# Altium footprint library IC.PcbLib: 108 footprints (part 8 of 8)
Each footprint in its own frame and in the unit in brackets; x right, y up, seen from the top. Pads: shape width x height; smd on the part's side, far side on the other; paste and mask are expansions set on the pad; w line width, h text height; cw(c..) or ccw(c..) is an arc to the next point about the centre after c.
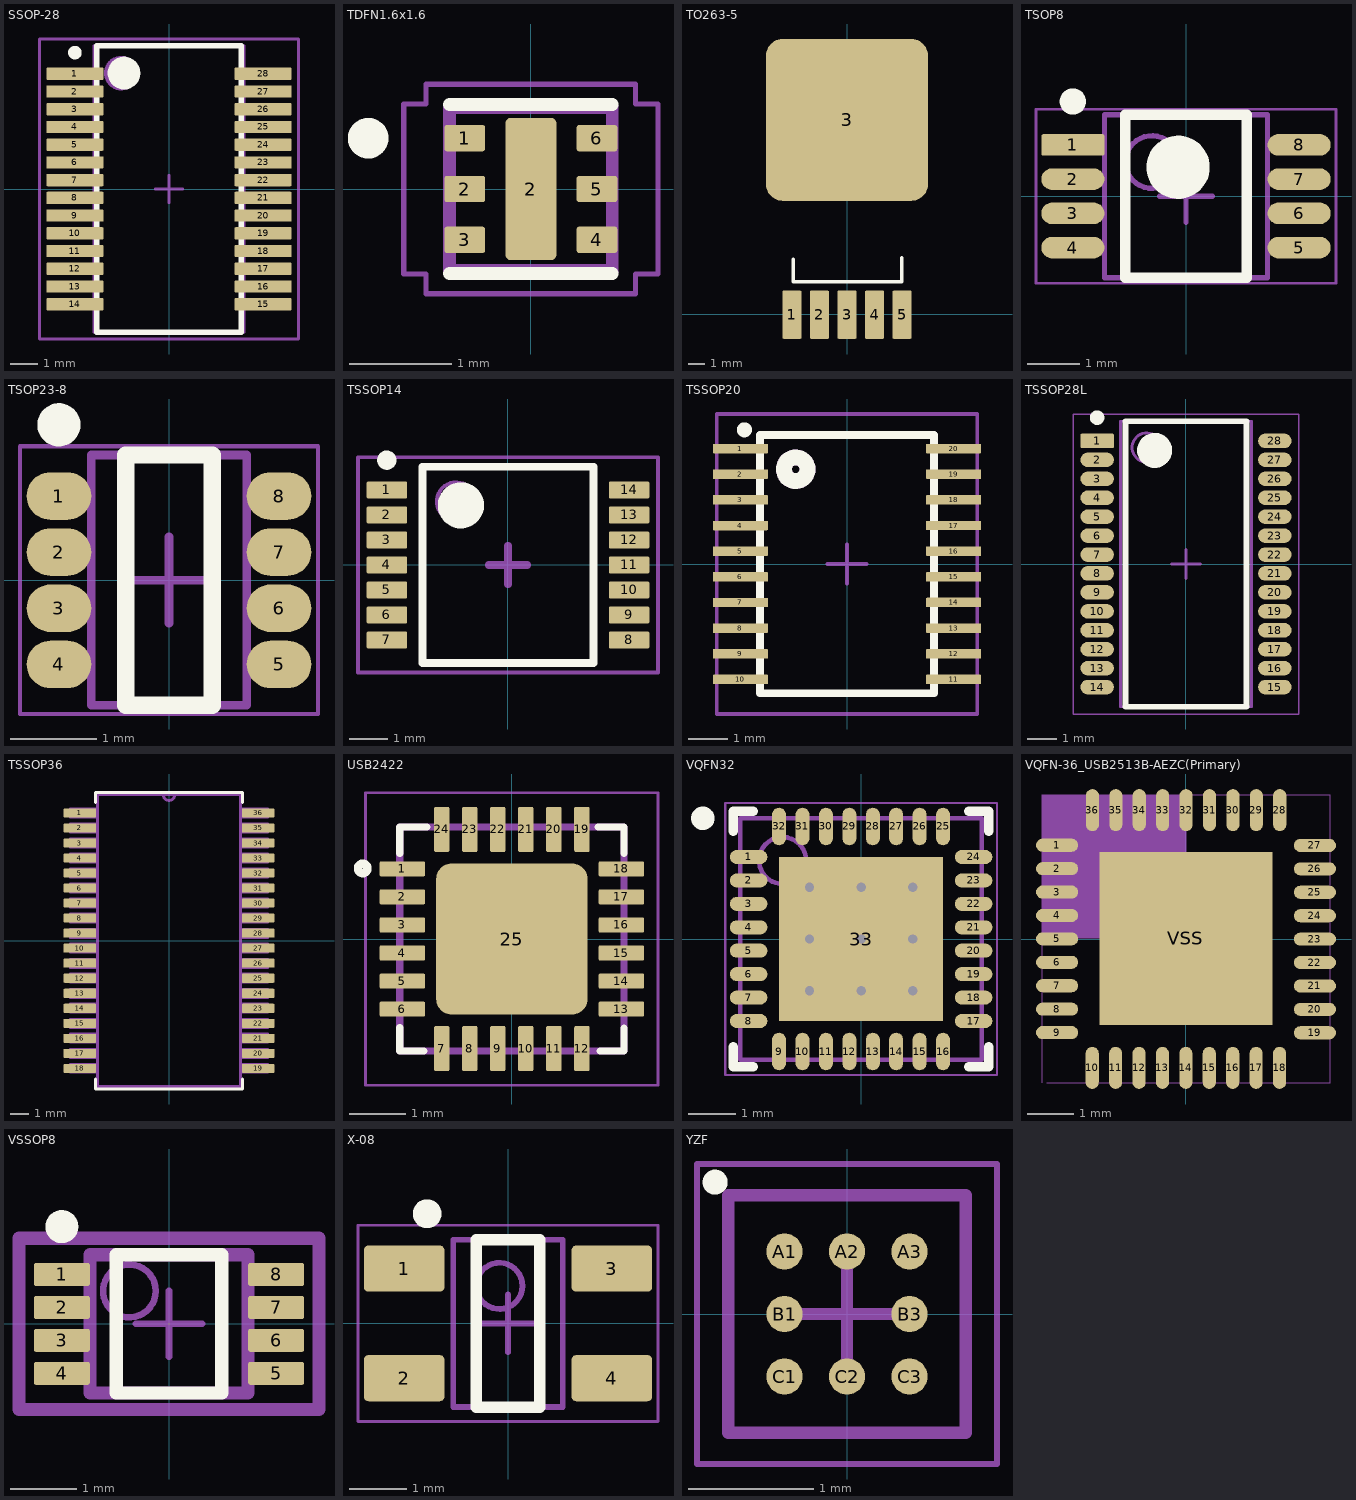
[diagram p7: the footprints below, top view; thin cyan lines are the x and y axes]

## SSOP-28 [mm] "ADS1282IPWR , SOP, 28-Leads, Body 10,5x5,3mm (max), Pitch 0,65mm, IPC Medium Density"
height 2.65
pads (28):
  rrect20% 2.1x0.45 smd: 1(-3.45,4.225) 2(-3.45,3.575) 3(-3.45,2.925) 4(-3.45,2.275) 5(-3.45,1.625) 6(-3.45,0.975) 7(-3.45,0.325) 8(-3.45,-0.325) 9(-3.45,-0.975) 10(-3.45,-1.625) 11(-3.45,-2.275) 12(-3.45,-2.925) 13(-3.45,-3.575) 14(-3.45,-4.225) 15(3.45,-4.225) 16(3.45,-3.575) 17(3.45,-2.925) 18(3.45,-2.275) 19(3.45,-1.625) 20(3.45,-0.975) 21(3.45,-0.325) 22(3.45,0.325) 23(3.45,0.975) 24(3.45,1.625) 25(3.45,2.275) 26(3.45,2.925) 27(3.45,3.575) 28(3.45,4.225)
Top Overlay:
  circle w0.25: c-3.45,5 r0.125
  circle w0.6: c-1.65,4.25 r0.3
  lines w0.2: -2.65,-5.25 -2.65,5.25 2.65,5.25 2.65,-5.25 -2.65,-5.25
M3_comm_top:
  text ".comment" at -3,-0.51 h2
M5_asm_top:
  circle w0.154: c-1.75,4.25 r0.559
  lines w0.1: -2.75,-5.25 2.75,-5.25 2.75,5.25 -2.75,5.25 -2.75,-5.25
  text ".Designator" at -1.75,5.5 h2
M7_courtyard_top:
  lines w0.1: -0.5,0 0.5,0 ; 0,-0.5 0,0.5 ; -4.75,-5.5 -4.75,5.5 4.75,5.5 4.75,-5.5 -4.75,-5.5
3D body "SSOP-28-FT232RL.STEP": height 2.16, standoff 0, extent -3.878,-5.175 3.878,5.155

## TDFN1.6x1.6 [mm] "MIC826TYMT-TR"
pads (7):
  rrect20% 0.4x0.26 smd: 1(-0.65,0.5) 2(-0.65,0) 3(-0.65,-0.5) 4(0.65,-0.5) 5(0.65,0) 6(0.65,0.5)
  rrect20% 0.5x1.4 smd: 2(0,0)
Top Overlay:
  circle w0.2: c-1.6,0.5 r0.1
  lines w0.127: -0.8,-0.83 0.8,-0.83 ; -0.8,0.83 0.8,0.83
Top Paste:
  region: 0.15,-0.568 -0.151,-0.568 -0.151,-0.035 0.15,-0.035
  region: -0.151,0.565 0.15,0.565 0.15,0.035 -0.151,0.035
M1_3D_TOP:
  lines w0.05: -1.25,-0.835 -1.25,0.835 -1.03,0.835 -1.03,1.03 1.03,1.03 1.03,0.835 1.25,0.835 1.25,-0.835 1.03,-0.835 1.03,-1.03 -1.03,-1.03 -1.03,-0.835 -1.25,-0.835
  lines w0.127: -0.8,-0.8 -0.8,0.8 0.8,0.8 0.8,-0.8 -0.8,-0.8
3D body: height 0.61, standoff 0.6, extent -0.599,0.4 -0.4,0.6
3D body: height 0.6, standoff 0, extent -0.8,-0.8 0.8,0.8

## TO263-5 [mm]
height 0.025
pads (6):
  rrect20% 1.2x3 smd mask+0.102: 1(-3.4,-0.033) 2(-1.7,-0.033) 3(0,-0.033) 4(1.7,-0.033) 5(3.4,-0.033)
  rrect20% 10x10 smd: 3(0,12)
Top Overlay:
  lines w0.203: -3.317,3.4 -3.317,1.999 3.389,1.999 3.389,3.5
3D body "SW3dPS-TO263-5.STEP": height 4.83, standoff 0.03, extent -5,-0.99 5,14.68

## TSOP8 [mm] "TSOP, 8-Leads, Body 3,10x3,10mm, Pitch 0,65mm, IPC High Density"
height 1.1
pads (8):
  rrect20% 1.2x0.41 smd: 1(-2.15,0.975)
  oval 1.2x0.41 smd: 2(-2.15,0.325) 3(-2.15,-0.325) 4(-2.15,-0.975) 5(2.15,-0.975) 6(2.15,-0.325) 7(2.15,0.325) 8(2.15,0.975)
Top Overlay:
  circle w0.6: c-0.15,0.55 r0.3
  circle w0.25: c-2.15,1.8 r0.125
  lines w0.2: -1.15,-1.55 1.15,-1.55 1.15,1.55 -1.15,1.55 -1.15,-1.55
Mechanical 13:
  circle w0.1: c-0.65,0.65 r0.5
  lines w0.1: -1.55,-1.55 1.55,-1.55 1.55,1.55 -1.55,1.55 -1.55,-1.55
Mechanical 15:
  lines w0.05: -2.85,-1.65 2.85,-1.65 2.85,1.65 -2.85,1.65 -2.85,-1.65
  lines w0.1: -0.5,0 0.5,0 ; 0,-0.5 0,0.5
3D body "TSOP8.step": height 1.1, standoff 0, extent -2.525,-1.55 2.525,1.55

## TSOP23-8 [mm] "TSOP, 8-Leads, Body 2,90x1,75mm, Pitch 0,65mm, IPC High Density"
height 1
pads (8):
  oval 0.75x0.55 smd: 1(-1.275,0.975) 2(-1.275,0.325) 3(-1.275,-0.325) 4(-1.275,-0.975) 5(1.275,-0.975) 6(1.275,-0.325) 7(1.275,0.325) 8(1.275,0.975)
Top Overlay:
  circle w0.25: c-1.275,1.8 r0.125
  lines w0.2: -0.5,-1.45 0.5,-1.45 0.5,1.45 -0.5,1.45 -0.5,-1.45
Mechanical 13:
  lines w0.1: -0.9,-1.45 0.9,-1.45 0.9,1.45 -0.9,1.45 -0.9,-1.45
Mechanical 15:
  lines w0.05: -1.725,-1.55 1.725,-1.55 1.725,1.55 -1.725,1.55 -1.725,-1.55
  lines w0.1: -0.5,0 0.5,0 ; 0,-0.5 0,0.5
3D body "TSOP23-8.step": height 1, standoff -0.02, extent -1.5,-1.45 1.5,1.45

## TSSOP14 [mm] "TLV8544PWR.TSOP, 14-Leads, Body 5,00x4,40mm, Pitch 0,65mm, IPC Medium Density"
height 1.2
pads (14):
  rrect20% 1.05x0.45 smd: 1(-3.15,1.95) 2(-3.15,1.3) 3(-3.15,0.65) 4(-3.15,0) 5(-3.15,-0.65) 6(-3.15,-1.3) 7(-3.15,-1.95) 8(3.15,-1.95) 9(3.15,-1.3) 10(3.15,-0.65) 11(3.15,0) 12(3.15,0.65) 13(3.15,1.3) 14(3.15,1.95)
Top Overlay:
  circle w0.25: c-3.15,2.725 r0.125
  circle w0.6: c-1.225,1.55 r0.3
  lines w0.2: -2.225,-2.55 -2.225,2.55 2.225,2.55 2.225,-2.55 -2.225,-2.55
M3_comm_top:
  text ".comment" at -0.9,-0.3 h1
M5_asm_top:
  circle w0.1: c-1.35,1.65 r0.5
  lines w0.1: -2.25,-2.55 -2.25,2.55 2.25,2.55 2.25,-2.55 -2.25,-2.55
  text ".Designator" at -1,1.3 h1
M7_courtyard_top:
  lines w0.1: -0.5,0 0.5,0 ; 0,-0.5 0,0.5 ; -3.9,-2.8 -3.9,2.8 3.9,2.8 3.9,-2.8 -3.9,-2.8
  lines w0.2: -0.5,0 0.5,0 ; 0,-0.5 0,0.5
3D body "TSSOP14.step": height 1.2, standoff 0, extent -3.4,-2.55 3.2,2.55

## TSSOP20 [mm] "HI-8444"
height 1.2
pads (20):
  rrect20% 1.4x0.24 smd: 1(-2.7,2.925) 2(-2.7,2.275) 3(-2.7,1.625) 4(-2.7,0.975) 5(-2.7,0.325) 6(-2.7,-0.325) 7(-2.7,-0.975) 8(-2.7,-1.625) 9(-2.7,-2.275) 10(-2.7,-2.925) 11(2.7,-2.925) 12(2.7,-2.275) 13(2.7,-1.625) 14(2.7,-0.975) 15(2.7,-0.325) 16(2.7,0.325) 17(2.7,0.975) 18(2.7,1.625) 19(2.7,2.275) 20(2.7,2.925)
Top Overlay:
  circle w0.4: c-1.3,2.4 r0.3
  circle w0.2: c-2.6,3.4 r0.09
  lines w0.2: -2.2,-3.275 2.2,-3.275 2.2,3.27 -2.2,3.27 -2.2,-3.275
M3_comm_top:
  text ".comment" at 0,0 h1
M5_asm_top:
  circle w0.4: c-1.3,2.4 r0.3
  lines w0.1: -2.2,-3.27 2.2,-3.27 2.2,3.27 -2.2,3.27 -2.2,-3.27
  text ".Designator" at -0.8,3.5 h1
M7_courtyard_top:
  lines w0.1: -0.5,0 0.5,0 ; 0,-0.5 0,0.5 ; -3.3,-3.8 3.3,-3.8 3.3,3.8 -3.3,3.8 -3.3,-3.8
3D body "User Library-TSSOP-20-2.STEP": height 1.2, standoff 0, extent -3.2,-3.25 3.2,3.25

## TSSOP28L [mm] "TSSOP28L, IPC Medium Density"
height 1.2
pads (28):
  rrect20% 1.15x0.5 smd: 1(-3.05,4.225)
  oval 1.15x0.5 smd: 2(-3.05,3.575) 3(-3.05,2.925) 4(-3.05,2.275) 5(-3.05,1.625) 6(-3.05,0.975) 7(-3.05,0.325) 8(-3.05,-0.325) 9(-3.05,-0.975) 10(-3.05,-1.625) 11(-3.05,-2.275) 12(-3.05,-2.925) 13(-3.05,-3.575) 14(-3.05,-4.225) 15(3.05,-4.225) 16(3.05,-3.575) 17(3.05,-2.925) 18(3.05,-2.275) 19(3.05,-1.625) 20(3.05,-0.975) 21(3.05,-0.325) 22(3.05,0.325) 23(3.05,0.975) 24(3.05,1.625) 25(3.05,2.275) 26(3.05,2.925) 27(3.05,3.575) 28(3.05,4.225)
Top Overlay:
  circle w0.6: c-1.075,3.9 r0.3
  circle w0.25: c-3.05,5.025 r0.125
  lines w0.2: -2.075,-4.9 2.075,-4.9 2.075,4.9 -2.075,4.9 -2.075,-4.9
Mechanical 13:
  circle w0.1: c-1.35,4 r0.5
  lines w0.1: -2.25,-4.9 2.25,-4.9 2.25,4.9 -2.25,4.9 -2.25,-4.9
Mechanical 15:
  lines w0.05: -3.875,-5.15 3.875,-5.15 3.875,5.15 -3.875,5.15 -3.875,-5.15
  lines w0.1: -0.5,0 0.5,0 ; 0,-0.5 0,0.5
3D body "TSSOP-28_P065.STEP": height 0.98, standoff -0.01, extent -3.2,-4.85 3.2,4.85

## TSSOP36 [mil] "max7300"
pads (36):
  rrect20% 68x19 smd: 1(-187,267.75) 2(-187,236.25) 3(-187,204.75) 4(-187,173.25) 5(-187,141.75) 6(-187,110.25) 7(-187,78.75) 8(-187,47.25) 9(-187,15.75) 10(-187,-15.75) 11(-187,-47.25) 12(-187,-78.75) 13(-187,-110.25) 14(-187,-141.75) 15(-187,-173.25) 16(-187,-204.75) 17(-187,-236.25) 18(-187,-267.75) 19(187,-267.75) 20(187,-236.25) 21(187,-204.75) 22(187,-173.25) 23(187,-141.75) 24(187,-110.25) 25(187,-78.75) 26(187,-47.25) 27(187,-15.75) 28(187,15.75) 29(187,47.25) 30(187,78.75) 31(187,110.25) 32(187,141.75) 33(187,173.25) 34(187,204.75) 35(187,236.25) 36(187,267.75)
Top Overlay:
  lines w6: -154,-290 -154,-311 154,-311 154,-290 ; -154,290 -154,311 154,311 154,290
M4_comm_bot:
  drawing of 302 lines, arcs and shapes, not listed

## USB2422 [mm] "QFN50P400X400X90-25N"
pads (25):
  rrect20% 0.81x0.27 smd: 1(-1.955,1.25) 2(-1.955,0.75) 3(-1.955,0.25) 4(-1.955,-0.25) 5(-1.955,-0.75) 6(-1.955,-1.25) 13(1.955,-1.25) 14(1.955,-0.75) 15(1.955,-0.25) 16(1.955,0.25) 17(1.955,0.75) 18(1.955,1.25)
  rrect20% 0.27x0.81 smd: 7(-1.25,-1.955) 8(-0.75,-1.955) 9(-0.25,-1.955) 10(0.25,-1.955) 11(0.75,-1.955) 12(1.25,-1.955) 19(1.25,1.955) 20(0.75,1.955) 21(0.25,1.955) 22(-0.25,1.955) 23(-0.75,1.955) 24(-1.25,1.955)
  rrect20% 2.7x2.7 smd: 25(0,0)
Top Overlay:
  circle w0.15: c-2.66,1.26 r0.085
  lines w0.127: -2,-1.58 -2,-2 -1.57,-2 ; -2,1.53 -2,2 -1.51,2 ; 1.54,2 2,2 2,1.53 ; 1.58,-2 2,-2 2,-1.59
Top Paste:
  region: -1.278,0.854 0.854,0.854 0.854,-1.278 -1.278,-1.278
M1_3D_TOP:
  lines w0.05: -2.61,-2.61 -2.61,2.61 2.61,2.61 2.61,-2.61 -2.61,-2.61
  lines w0.127: -2,-2 -2,2 2,2 2,-2 -2,-2

## VQFN32 [mm] "TLK105L, QFN, 32-Leads, Body 5,15x5,15mm, Pitch 0,50mm, Thermal Pad 3,50x3,50mm, IPC High Density"
height 1
pads (33):
  oval 0.8x0.3 smd: 1(-2.4,1.75) 2(-2.4,1.25) 3(-2.4,0.75) 4(-2.4,0.25) 5(-2.4,-0.25) 6(-2.4,-0.75) 7(-2.4,-1.25) 8(-2.4,-1.75) 17(2.4,-1.75) 18(2.4,-1.25) 19(2.4,-0.75) 20(2.4,-0.25) 21(2.4,0.25) 22(2.4,0.75) 23(2.4,1.25) 24(2.4,1.75)
  oval 0.3x0.8 smd: 9(-1.75,-2.4) 10(-1.25,-2.4) 11(-0.75,-2.4) 12(-0.25,-2.4) 13(0.25,-2.4) 14(0.75,-2.4) 15(1.25,-2.4) 16(1.75,-2.4) 25(1.75,2.4) 26(1.25,2.4) 27(0.75,2.4) 28(0.25,2.4) 29(-0.25,2.4) 30(-0.75,2.4) 31(-1.25,2.4) 32(-1.75,2.4)
  rect 3.5x3.5 smd: 33(0,0)
via 1.1,-1.1 diameter 0.5 hole 0.2
via 0,-1.1 diameter 0.5 hole 0.2
via -1.1,-1.1 diameter 0.5 hole 0.2
via 1.1,0 diameter 0.5 hole 0.2
via 0,0 diameter 0.5 hole 0.2
via -1.1,0 diameter 0.5 hole 0.2
via 1.1,1.1 diameter 0.5 hole 0.2
via 0,1.1 diameter 0.5 hole 0.2
via -1.1,1.1 diameter 0.5 hole 0.2
Top Overlay:
  circle w0.25: c-3.375,2.575 r0.125
  lines w0.2: -2.725,-2.3 -2.725,-2.725 -2.3,-2.725 ; -2.725,2.3 -2.725,2.725 -2.3,2.725 ; 2.3,-2.725 2.725,-2.725 2.725,-2.3 ; 2.3,2.725 2.725,2.725 2.725,2.3
Mechanical 13:
  circle w0.1: c-1.675,1.675 r0.5
  lines w0.1: -2.575,-2.575 2.575,-2.575 2.575,2.575 -2.575,2.575 -2.575,-2.575
Mechanical 15:
  lines w0.05: -2.9,-2.9 2.9,-2.9 2.9,2.9 -2.9,2.9 -2.9,-2.9
  lines w0.1: -0.5,0 0.5,0 ; 0,-0.5 0,0.5
3D body "VQFN32.step": height 1, standoff 0, extent -2.625,-2.625 2.625,2.625

## VQFN-36_USB2513B-AEZC(Primary) [mm] "USB2513B-AEZC"
pads (37):
  oval 0.9x0.28 smd: 1(-2.753,2.002) 2(-2.753,1.502) 3(-2.753,1.002) 4(-2.753,0.502) 5(-2.753,0.002) 6(-2.753,-0.498) 7(-2.753,-0.998) 8(-2.753,-1.498) 9(-2.753,-1.998) 19(2.753,-2.002) 20(2.753,-1.502) 21(2.753,-1.002) 22(2.753,-0.502) 23(2.753,-0.002) 24(2.753,0.498) 25(2.753,0.998) 26(2.753,1.498) 27(2.753,1.998)
  oval 0.28x0.9 smd: 10(-2.003,-2.752) 11(-1.502,-2.752) 12(-1.002,-2.752) 13(-0.503,-2.752) 14(-0.002,-2.752) 15(0.497,-2.752) 16(0.998,-2.752) 17(1.498,-2.752) 18(1.997,-2.752) 28(2.002,2.752) 29(1.502,2.752) 30(1.002,2.752) 31(0.502,2.752) 32(0.002,2.752) 33(-0.498,2.752) 34(-0.998,2.752) 35(-1.498,2.752) 36(-1.998,2.752)
  rect 3.7x3.7 smd: VSS(0,0.012)
M1_3D_TOP:
  region: -3.07,3.081 0.001,3.081 0.001,0.018 -3.07,0.018
  lines w0: -3.07,-3.072 -3.07,3.078 3.08,3.078 3.08,-3.072 -2.97,-3.072
  text "1" at -3.772,1.795 h1.88
  text "36" at -2.167,3.398 h1.88

## VSSOP8 [mm] "74AUP2G02DC, SOT765-1, TSSOP, 8-Leads, Body 2,10x2,40mm, Pitch 0,50mm, IPC Medium Density"
height 1
pads (8):
  rrect20% 0.85x0.35 smd: 1(-1.625,0.75) 2(-1.625,0.25) 3(-1.625,-0.25) 4(-1.625,-0.75) 5(1.625,-0.75) 6(1.625,-0.25) 7(1.625,0.25) 8(1.625,0.75)
Top Overlay:
  circle w0.25: c-1.625,1.475 r0.125
  lines w0.2: -0.8,-1.05 -0.8,1.05 0.8,1.05 0.8,-1.05 -0.8,-1.05
M5_asm_top:
  circle w0.1: c-0.6,0.5 r0.4
  lines w0.2: -1.2,-1.05 -1.2,1.05 1.2,1.05 1.2,-1.05 -1.2,-1.05
M7_courtyard_top:
  lines w0.1: -0.5,0 0.5,0 ; 0,-0.5 0,0.5
  lines w0.2: -2.275,-1.3 -2.275,1.3 2.275,1.3 2.275,-1.3 -2.275,-1.3
3D body "VSSOP8.step": height 1, standoff 0, extent -1.5,-1.05 1.5,1.05

## X-08 [mm] "PHI611"
height 1.1
pads (4):
  rrect20% 1.4x0.8 smd: 1(-1.8,0.95) 2(-1.8,-0.95) 3(1.8,0.95) 4(1.8,-0.95)
Top Overlay:
  circle w0.25: c-1.4,1.9 r0.125
  lines w0.2: -0.55,-1.45 0.55,-1.45 0.55,1.45 -0.55,1.45 -0.55,-1.45
Mechanical 13:
  circle w0.1: c-0.15,0.65 r0.4
  lines w0.1: -0.95,-1.45 0.95,-1.45 0.95,1.45 -0.95,1.45 -0.95,-1.45
Mechanical 15:
  lines w0.05: -2.6,-1.7 2.6,-1.7 2.6,1.7 -2.6,1.7 -2.6,-1.7
  lines w0.1: -0.5,0 0.5,0 ; 0,-0.5 0,0.5
3D body "X-08.step": height 1.1, standoff 0.01, extent -1.393,-1.45 1.393,1.45

## YZF [mm] "TMP007AIYZFR, Pitch 0.50mm"
height 0.63
pads (8):
  round 0.29 smd: A1(-0.5,0.5) A2(0,0.5) A3(0.5,0.5) B1(-0.5,0) B3(0.5,0) C1(-0.5,-0.5) C2(0,-0.5) C3(0.5,-0.5)
Top Overlay:
  circle w0.1: c-1.055,1.055 r0.05
Mechanical 13:
  lines w0.1: -0.95,-0.95 -0.95,0.95 0.95,0.95 0.95,-0.95 -0.95,-0.95
Mechanical 15:
  lines w0.05: -1.2,-1.2 -1.2,1.2 1.2,1.2 1.2,-1.2 -1.2,-1.2
  lines w0.1: -0.5,0 0.5,0 ; 0,-0.5 0,0.5
3D body "YZF.step": height 0.63, standoff 0, extent -0.95,-0.95 0.95,0.95